# Altium footprint library std-th.PcbLib: 245 footprints (part 6 of 16)
Each footprint in its own frame and in the unit in brackets; x right, y up, seen from the top. Pads: shape width x height; smd on the part's side, far side on the other; paste and mask are expansions set on the pad; w line width, h text height; cw(c..) or ccw(c..) is an arc to the next point about the centre after c.
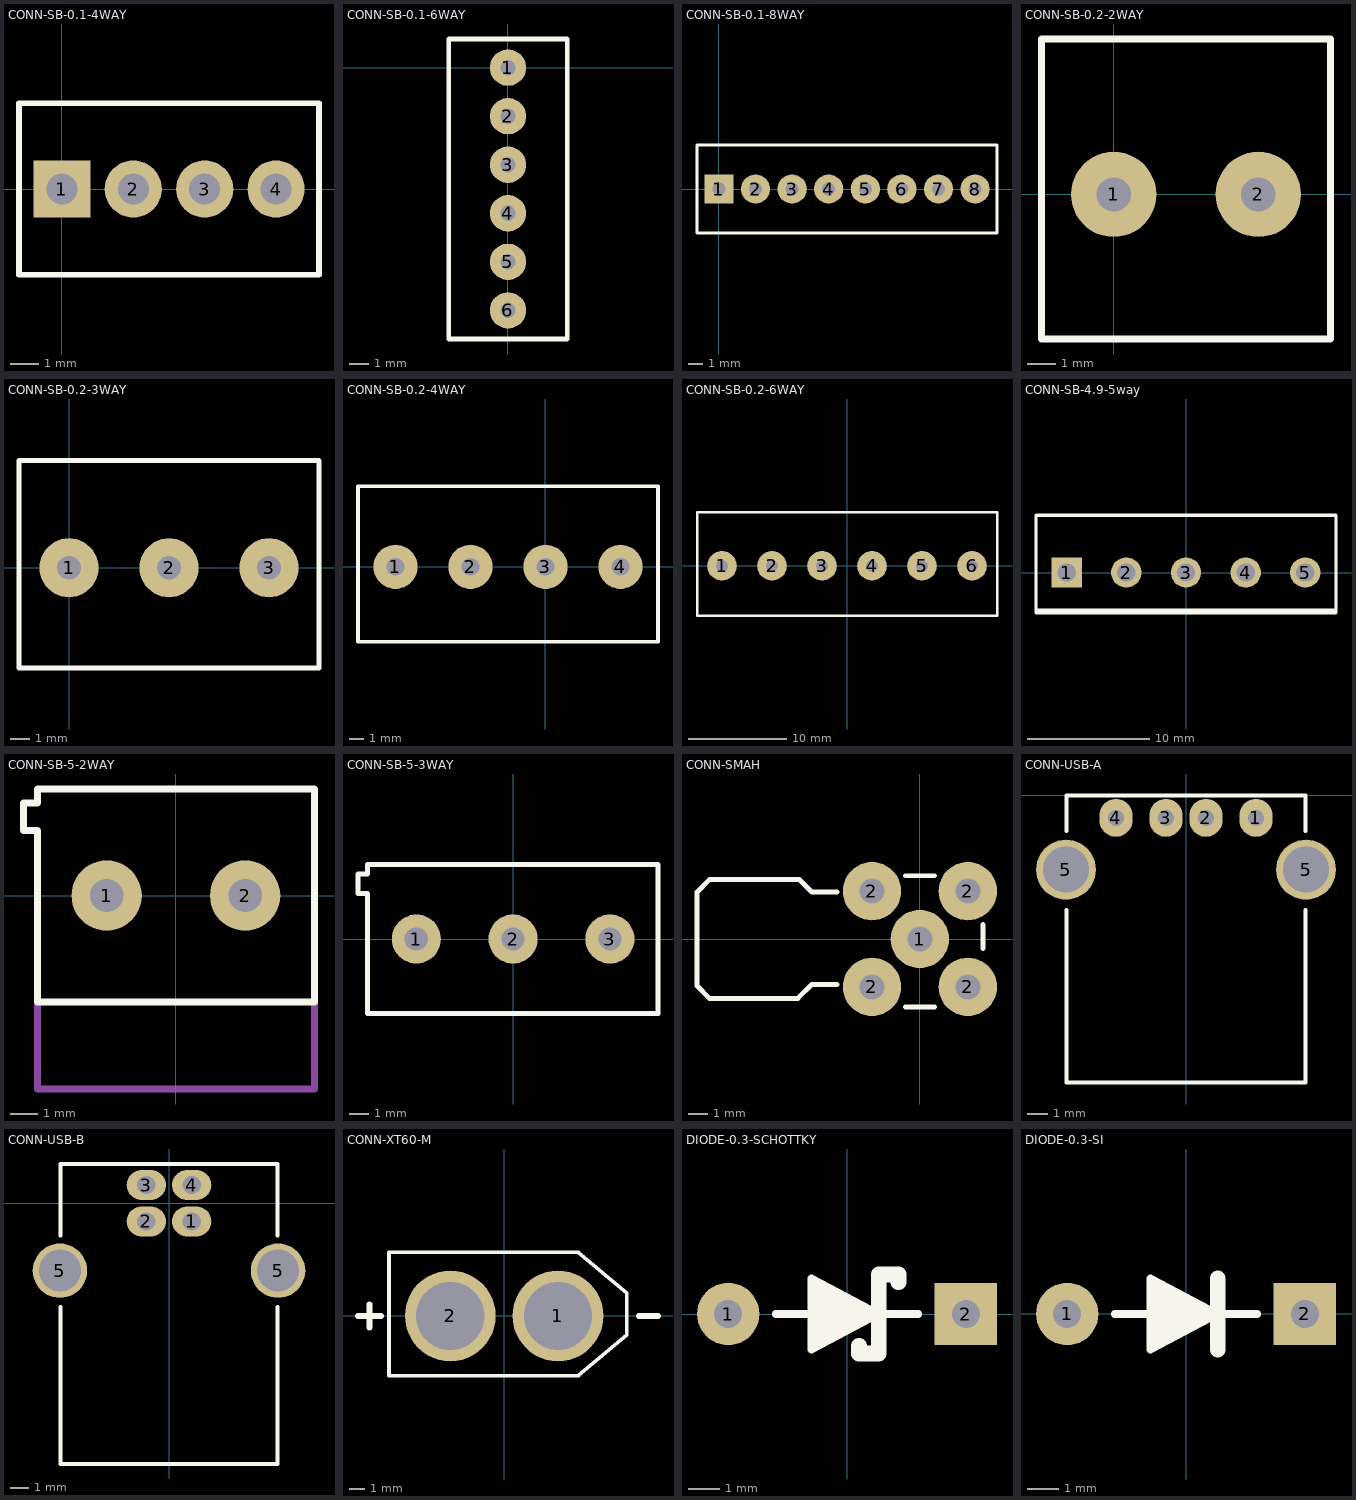
[diagram p5: the footprints below, top view; thin cyan lines are the x and y axes]

## CONN-SB-0.1-4WAY [mil] "Screw Terminal Block, 1 row 4 way, 100 mil pitch"
height 250
pads (4):
  rect 80x80 hole 43.31: 1(0,0)
  round 80 hole 43.31: 2(100,0) 3(200,0) 4(300,0)
Top Overlay:
  lines w7.87: -60,-120 360,-120 360,120 -60,120 -60,-120
3D body: height 334.65, standoff -137.8, extent -59.05,-122.04 359.06,122.05

## CONN-SB-0.1-6WAY [mm] "Screw Terminal Block, 1 row 6 way, 100 mil pitch"
height 6.35
pads (6):
  round 1.905 hole 0.8: 1(0,0) 2(0,-2.54) 3(0,-5.08) 4(0,-7.62) 5(0,-10.16) 6(0,-12.7)
Top Overlay:
  lines w0.254: 3.1,-14.2 -3.1,-14.2 -3.1,1.5 3.1,1.5 ; 3.1,-14.2 3.1,-14.2 ; 3.1,-14.2 3.1,1.5 ; 3.1,1.5 3.1,1.5
3D body: height 8.5, standoff -3.5, extent -3.1,-14.2 3.1,1.5

## CONN-SB-0.1-8WAY [mil] "Screw Terminal Block, 1 row 8 way, 100 mil pitch"
height 250
pads (8):
  rect 80x80 hole 35.43: 1(0,0)
  round 80 hole 35.43: 2(100,0) 3(200,0) 4(300,0) 5(400,0) 6(500,0) 7(600,0) 8(700,0)
Top Overlay:
  lines w7.87: -60,-120 -60,120 760,120 760,-120 -60,-120
3D body: height 334.65, standoff -137.8, extent -59.05,-122.05 759.06,122.05

## CONN-SB-0.2-2WAY [mm] "Screw Terminal Block, 1 row 2 way, 5.08 mm pitch"
height 10
pads (2):
  round 3 hole 1.2: 1(0,0) 2(5.08,0)
Top Overlay:
  lines w0.254: -2.54,-5.08 7.62,-5.08 7.62,5.461 -2.54,5.461 -2.54,-5.08
3D body: height 14, standoff -4, extent -2.507,-5.039 7.493,5.461

## CONN-SB-0.2-3WAY [mm] "Screw Terminal Block, 1 row 3 way, 5.08 mm pitch"
height 10
pads (3):
  round 3 hole 1.2: 1(0,0) 2(5.08,0) 3(10.16,0)
Top Overlay:
  lines w0.254: -2.54,-5.08 12.7,-5.08 12.7,5.461 -2.54,5.461 -2.54,-5.08
3D body: height 14, standoff -4, extent -2.395,-5.026 12.605,5.474

## CONN-SB-0.2-4WAY [mm] "Screw Terminal Block, 1 row 4 way, 5.08 mm pitch"
height 10
pads (4):
  round 3 hole 1.2: 1(-10.16,0) 2(-5.08,0) 3(0,0) 4(5.08,0)
Top Overlay:
  lines w0.254: -12.7,-5.08 7.62,-5.08 7.62,5.461 -12.7,5.461 -12.7,-5.08
3D body: height 14, standoff -4, extent -2.507,-5.039 7.493,5.461
3D body: height 14, standoff -4, extent -12.667,-5.039 -2.667,5.461

## CONN-SB-0.2-6WAY [mm] "Screw Terminal Block, 1 row 6 way, 5.08 mm pitch"
height 10
pads (6):
  round 3 hole 1.2: 1(-12.7,0) 2(-7.62,0) 3(-2.54,0) 4(2.54,0) 5(7.62,0) 6(12.7,0)
Top Overlay:
  lines w0.254: -15.24,-5.08 -15.24,5.461 15.24,5.461 15.24,-5.08 -15.24,-5.08
3D body: height 14, standoff -4, extent -15.095,-5.026 -0.095,5.474
3D body: height 14, standoff -4, extent 0.145,-5.026 15.145,5.474

## CONN-SB-4.9-5way [mm] "Screw block, 5 way, 4.90 mm pitch"
height 10
pads (5):
  rect 2.5x2.5 hole 1.5: 1(-9.8,0)
  round 2.5 hole 1.5: 2(-4.9,0) 3(0,0) 4(4.9,0) 5(9.8,0)
Top Overlay:
  lines w0.203: -12.319,-3.048 12.319,-3.048
  lines w0.254: -12.319,-3.302 -12.319,4.699 12.319,4.699 12.319,-3.302 -12.319,-3.302
3D body: height 10, standoff -3.5, extent -12.366,-3.301 -2.366,4.699
3D body: height 10, standoff -3.5, extent -7.54,-3.301 2.46,4.699
3D body: height 10, standoff -3.5, extent 2.366,-3.301 12.366,4.699

## CONN-SB-5-2WAY [mm] "Screw Terminal Block, 1 row 2 way, 5 mm pitch"
height 10
pads (2):
  round 2.54 hole 1.2: 1(-2.5,0) 2(2.5,0)
Top Overlay:
  lines w0.254: 5,-3.85 5,3.85 -5,3.85 -5,3.35 -5.5,3.35 -5.5,2.35 -5,2.35 -5,-3.85 ; 5,-3.85 -5,-3.85 ; -5,-3.85 -5,-3.85
Mechanical 1:
  lines w0.254: -5,-3.85 -5,-6.985 ; -5,-6.985 5,-6.985 ; -5,-6.985 -5,-6.985 ; 5,-6.985 5,-3.81 ; 5,-6.985 5,-6.985 ; 5,-3.81 5,-3.81
3D body: height 10, standoff -2.28, extent -5.5,-3.85 5,3.85

## CONN-SB-5-3WAY [mm] "Screw Terminal Block, 1 row 3 way, 5 mm pitch"
height 10
pads (3):
  round 2.54 hole 1.2: 1(-5,0) 2(0,0) 3(5,0)
Top Overlay:
  lines w0.254: -8.014,2.35 -7.514,2.35 -7.514,-3.85 7.486,-3.85 7.486,-3.85 7.486,3.85 7.486,3.85 -7.514,3.85 -7.514,3.35 -8.014,3.35 -8.014,2.35
Mechanical 1:
  lines w0.254: 7.486,-3.85 7.486,-3.85
3D body: height 10.05, standoff -2.24, extent -8.014,-3.85 7.486,3.85

## CONN-SMAH [mm] "SMA connector, female, right angle"
height 10
pads (5):
  round 3.048 hole 1.3: 1(0,0) 2(-2.5,-2.5) 2(-2.5,2.5) 2(2.5,-2.5) 2(2.5,2.5)
Top Overlay:
  lines w0.254: -4.318,-2.367 -5.633,-2.367 -6.367,-3.1 -10.983,-3.1 -11.633,-2.45 -11.633,2.367 -11.633,2.45 -10.983,3.1 -6.283,3.1 -5.633,2.45 -4.318,2.45 ; -0.762,-3.556 0.762,-3.556 ; -0.762,3.302 0.762,3.302 ; 3.302,-0.508 3.302,0.762
3D body: height 3.51, standoff -9.98, extent -11.633,-3.175 3.175,3.175
3D body: height 48.75, standoff 1.89, extent -22.314,-4.5 -4.064,4.5

## CONN-USB-A [mm] "USB Connector, A Termination, Horizontal"
height 10
pads (6):
  oval 1.651x1.905 hole 0.8 unplated: 1(3.5,-1.114) 2(1,-1.114) 3(-1,-1.114) 4(-3.5,-1.114)
  round 3 hole 2.3: 5(-6,-3.71) 5(6,-3.71)
Top Overlay:
  lines w0.203: -5.969,-5.715 -5.969,-14.351 5.969,-14.351 5.969,-5.715 ; -5.969,-1.778 -5.969,0 5.969,0 5.969,-1.778
3D body: height 7.5, standoff -4, extent -7.8,-14.224 7.8,-0.024

## CONN-USB-B [mm] "USB Connector, B Termination, Horizontal"
height 10
pads (6):
  oval 2.159x1.651 hole 1: 1(1.25,-1) 2(-1.25,-1) 3(-1.25,1) 4(1.25,1)
  round 3 hole 2.3: 5(-6,-3.71) 5(6,-3.71)
Top Overlay:
  lines w0.203: -5.969,-5.715 -5.969,-14.351 5.969,-14.351 5.969,-5.715 ; -5.969,-1.778 -5.969,2.159 5.969,2.159 5.969,-1.778
3D body: height 11, standoff -3.64, extent -7.399,-14.026 7.397,2.474

## CONN-XT60-M [mm] "Connector, XT60, male"
height 15
pads (2):
  round 6 hole 4.5 unplated: 1(3.556,0) 2(-3.556,0)
Top Overlay:
  lines w0.254: -7.6,-3.95 4.9,-3.95 8.1,-1.275 8.1,1.525 4.9,4.2 -7.6,4.2 -7.6,-3.95
  lines w0.381: -9.652,0 -8.128,0 ; -8.89,-0.762 -8.89,0.762 ; 8.89,0 10.16,0
3D body: height 16.2, standoff -5, extent -7.7,-3.95 8.2,4.2

## DIODE-0.3-SCHOTTKY [mm] "Axial Schottky Diode, Leads 0.3 inch spacing"
height 2.8
pads (2):
  round 2 hole 0.9: 1(-3.81,0)
  rect 2x2 hole 0.9: 2(3.81,0)
Top Overlay:
  region: -1.143,1.143 1.016,0 -1.143,-1.143
  lines w0.254: -2.286,0 2.286,0 ; -1.143,-1.143 -1.143,1.143 1.016,0 -1.143,-1.143
  lines w0.508: 0.381,-1.016 0.381,-1.27 1.016,-1.27 1.016,1.27 1.651,1.27 1.651,1.016
3D body: height 3.06, standoff -1.27, extent -4.204,-1.333 4.204,1.334

## DIODE-0.3-SI [mm] "Axial Silicon Diode, Leads 0.3 inch spacing"
height 2.8
pads (2):
  round 2 hole 0.9: 1(-3.81,0)
  rect 2x2 hole 0.9: 2(3.81,0)
Top Overlay:
  region: -1.143,1.143 1.016,0 -1.143,-1.143
  lines w0.254: -2.286,0 2.286,0 ; -1.143,-1.143 1.016,0 -1.143,1.143 -1.143,-1.143
  lines w0.508: 1.016,-1.143 1.016,1.143
3D body: height 3.06, standoff -1.27, extent -4.204,-1.333 4.204,1.334